# Altium footprint library CustomCase.PcbLib: 274 footprints (part 3 of 18)
Each footprint in its own frame and in the unit in brackets; x right, y up, seen from the top. Pads: shape width x height; smd on the part's side, far side on the other; paste and mask are expansions set on the pad; w line width, h text height; cw(c..) or ccw(c..) is an arc to the next point about the centre after c.
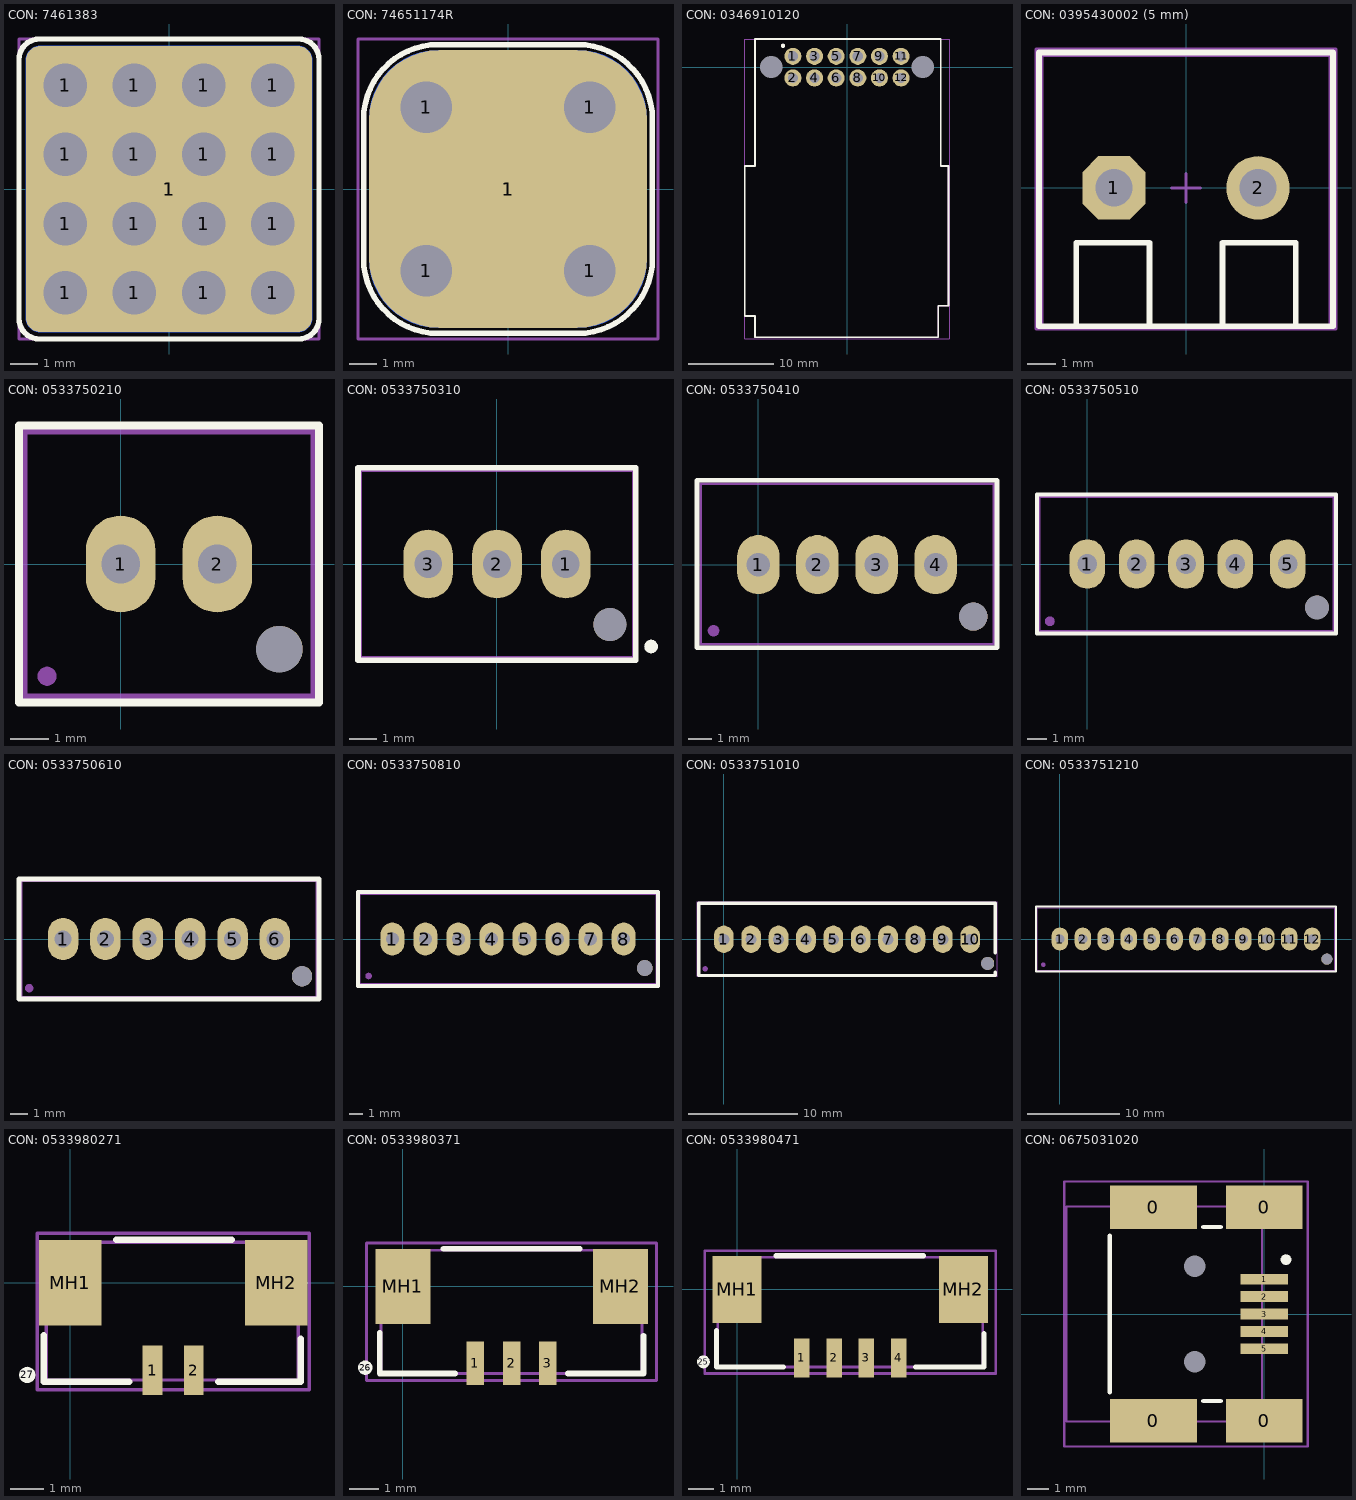
[diagram p2: the footprints below, top view; thin cyan lines are the x and y axes]

## CON: 7461383 [mm]
pads (18):
  round 2.5 hole 1.6: 1(-3.81,-3.81) 1(-3.81,-1.27) 1(-3.81,1.27) 1(-3.81,3.81) 1(-1.27,-3.81) 1(-1.27,-1.27) 1(-1.27,1.27) 1(-1.27,3.81) 1(1.27,-3.81) 1(1.27,-1.27) 1(1.27,1.27) 1(1.27,3.81) 1(3.81,-3.81) 1(3.81,-1.27) 1(3.81,1.27) 1(3.81,3.81)
  rrect10% 10.5x10.5 smd: 1(0,0)
  rrect10% 10.5x10.5 smd far side: 1(0,0)
Top Overlay:
  lines w0.2: -5.5,-4.75 ccw(c-4.75,-4.75) -4.75,-5.5 4.75,-5.5 ccw(c4.75,-4.75) 5.5,-4.75 5.5,4.75 ccw(c4.75,4.75) 4.75,5.5 -4.75,5.5 ccw(c-4.75,4.75) -5.5,4.75 -5.5,-4.75
Top Assy:
  lines w0.1: -4.5,-4.5 -4.5,4.5 ; -4.5,-4.5 -4.5,-4.5 ; -4.5,-4.5 4.5,-4.5 4.5,4.5 -4.5,4.5 ; -4.5,4.5 -4.5,4.5
Size Area:
  lines w0.1: -0.5,0 0.5,0 ; 0,-0.5 0,0.5 ; -5.5,-5.5 5.5,-5.5 5.5,5.5 -5.5,5.5 -5.5,-5.5
3D body "7461383.STEP": height 12.5, standoff -3.5, extent -4.5,-4.5 4.5,4.5

## CON: 74651174R [mm]
pads (6):
  round 3.2 hole 1.85: 1(-2.94,-2.94) 1(-2.94,2.94) 1(2.94,-2.94) 1(2.94,2.94)
  rrect50% 10x10 smd: 1(0,0)
  rrect50% 10x10 smd far side: 1(0,0)
Top Overlay:
  lines w0.2: -5.2,-2.5 ccw(c-2.5,-2.5) -2.5,-5.2 2.5,-5.2 ccw(c2.5,-2.5) 5.2,-2.5 5.2,2.5 ccw(c2.5,2.5) 2.5,5.2 -2.5,5.2 ccw(c-2.5,2.5) -5.2,2.5 -5.2,-2.5
Top Assy:
  circle w0.1: c0,0 r1.5
  lines w0.1: 0,2 ccw(c0,0) 2,0 ; -3.5,-3.5 3.5,-3.5 3.5,3.5 -3.5,3.5 -3.5,-3.5
Size Area:
  lines w0.1: -5.4,-5.4 5.4,-5.4 5.4,5.4 -5.4,5.4 -5.4,-5.4
3D body "74651174 (rev1).stp": height 8.5, standoff -2.5, extent -3.5,-3.5 3.5,3.5

## CON: 0346910120 [mm]
pads (16):
  round 2 hole 1.2: 1(-6.35,1.27) 2(-6.35,-1.27) 3(-3.81,1.27) 4(-3.81,-1.27) 5(-1.27,1.27) 6(-1.27,-1.27) 7(1.27,1.27) 8(1.27,-1.27) 9(3.81,1.27) 10(3.81,-1.27) 11(6.35,1.27) 12(6.35,-1.27)
  round 0 hole 2.6: ""(-8.89,0) ""(8.89,0)
  round 0.5 on Top Overlay: ""(-7.5,2.5)
  round 0.5 on Mech1: ""(-7.5,2.5)
Top Overlay:
  lines w0.2: -12,-29.2 -10.8,-29.2 -10.8,-31.7 10.7,-31.7 10.7,-28 11.9,-28 11.9,-11.6 11,-11.6 11,3.3 -10.8,3.3 -10.8,-11.6 -12,-11.6 -12,-29.2
Top Assy:
  lines w0.1: -12,-29.2 -12,-11.6 -10.8,-11.6 -10.8,3.3 11,3.3 11,-11.6 11.9,-11.6 11.9,-28 10.7,-28 10.7,-31.7 -10.8,-31.7 -10.8,-29.2 -12,-29.2
Size Area:
  lines w0.1: -12,-31.9 -12,3.3 12,3.3 12,-31.9 -12,-31.9
3D body "2.STEP": height 22.06, standoff -3.4, extent -12,-31.882 11.94,3.282

## CON: 0395430002 (5 mm) [mm] "2 pin 5.08mm screw connector"
height 12.5
pads (2):
  oct 2.2x2.2 hole 1.3: 1(-2.5,0)
  round 2.2 hole 1.3: 2(2.5,0)
Top Overlay:
  lines w0.2: -3.81,-4.8 -3.81,-1.905 -1.27,-1.905 -1.27,-4.8 ; 1.27,-4.8 1.27,-1.905 3.81,-1.905 3.81,-4.8 ; -5.1,-4.8 -5.1,4.7 5.1,4.7 5.1,-4.8 -5.1,-4.8
Top Assy:
  lines w0.1: -3.8,-4.799 -3.8,-1.9 -1.3,-1.9 -1.3,-4.799 ; 1.3,-4.8 1.3,-1.9 3.8,-1.9 3.8,-4.799 ; -5.004,-4.799 5.004,-4.799 5.004,4.599 -5.004,4.599 -5.004,-4.799
Size Area:
  lines w0.1: -0.5,0 0.5,0 ; 0,-0.5 0,0.5 ; -5.207,-4.9 -5.207,4.826 5.207,4.826 5.207,-4.9 -5.207,-4.9
3D body "395430002.SLDPRT": height 14.63, standoff -3.43, extent -5.004,-4.799 5.004,4.599

## CON: 0533750210 [mm] "MOLEX Mini-Lock"
height 11.5
pads (4):
  oval 1.8x2.5 hole 1: 1(0,0) 2(2.5,0)
  round 0.5 on Mech1: ""(-1.9,-2.9)
  round 1.2 hole 1.2: ""(4.1,-2.2)
Top Overlay:
  lines w0.2: -2.625,-3.575 5.125,-3.575 5.125,3.575 -2.625,3.575 -2.625,-3.575
Top Assy:
  lines w0.1: -2.45,-3.4 4.95,-3.4 4.95,3.4 -2.45,3.4 -2.45,-3.4
Size Area:
  lines w0.1: -2.5,-3.5 -2.5,3.5 5,3.5 5,-3.5 -2.5,-3.5
3D body "533750210.stp": height 11.75, standoff -3.18, extent -2.45,-3.4 4.95,3.4

## CON: 0533750310 [mm]
pads (6):
  oval 1.8x2.5 hole 1: 1(2.5,0) 2(0,0) 3(-2.5,0)
  round 1.2 hole 1.2: ""(4.1,-2.2)
  round 0.5 on Mech1: ""(4.1,-2.2)
  round 0.5 on Top Overlay: ""(5.6,-3)
Top Overlay:
  lines w0.2: -5.05,-3.5 5.05,-3.5 5.05,3.5 -5.05,3.5 -5.05,-3.5
Top Assy:
  lines w0.1: -4.95,-3.4 -4.95,3.4 4.95,3.4 4.95,-3.4 -4.95,-3.4
Size Area:
  lines w0.1: -0.5,0 0.5,0 ; 0,-0.5 0,0.5 ; -5,-3.5 5,-3.5 5,3.5 -5,3.5 -5,-3.5
3D body "533750310.stp": height 11.55, standoff -3.38, extent -4.95,-3.4 4.95,3.4

## CON: 0533750410 [mm] "MOLEX Mini-Lock"
height 11.5
pads (6):
  oval 1.8x2.5 hole 1: 1(0,0) 2(2.5,0) 3(5,0) 4(7.5,0)
  round 0.5 on Mech1: ""(-1.9,-2.8)
  round 1.2 hole 1.2: ""(9.1,-2.2)
Top Overlay:
  lines w0.2: -2.6,-3.525 10.1,-3.525 10.1,3.575 -2.6,3.575 -2.6,-3.525
Top Assy:
  lines w0.1: -2.441,-3.374 9.959,-3.374 9.959,3.426 -2.441,3.426 -2.441,-3.374
3D body "533750410.stp": height 11.55, standoff -3.38, extent -2.441,-3.374 9.959,3.426

## CON: 0533750510 [mm] "MOLEX Mini-Lock"
height 11.5
pads (7):
  oval 1.8x2.5 hole 1: 1(0,0) 2(2.5,0) 3(5,0) 4(7.5,0) 5(10.16,0)
  round 0.5 on Mech1: ""(-1.9,-2.9)
  round 1.2 hole 1.2: ""(11.64,-2.2)
Top Overlay:
  lines w0.2: -2.55,-3.525 -2.55,3.525 12.6,3.525 12.6,-3.525 -2.55,-3.525
Top Assy:
  lines w0.1: -2.425,-3.4 12.475,-3.4 12.475,3.4 -2.425,3.4 -2.425,-3.4
Size Area:
  lines w0.1: -2.6,-3.5 -2.6,3.5 12.6,3.5 12.6,-3.5 -2.6,-3.5
3D body "533750510.stp": height 11.55, standoff -3.38, extent -2.425,-3.4 12.475,3.4

## CON: 0533750610 [mm] "MOLEX Mini-Lock"
height 11.5
pads (8):
  oval 1.8x2.5 hole 1: 1(10,0) 2(12.5,0) 3(15,0) 4(17.5,0) 5(20,0) 6(22.5,0)
  round 0.5 on Mech1: ""(8,-2.9)
  round 1.2 hole 1.2: ""(24.1,-2.2)
Top Overlay:
  lines w0.3: 7.4,-3.55 25.1,-3.55 25.1,3.55 7.4,3.55 7.4,-3.55
Top Assy:
  lines w0.1: 7.55,-3.4 7.55,3.4 24.95,3.4 24.95,-3.4 7.55,-3.4
3D body "533750610.stp": height 11.55, standoff -3.38, extent 7.55,-3.4 24.95,3.4

## CON: 0533750810 [mm] "MOLEX Mini-Lock"
height 11.5
pads (10):
  oval 1.8x2.5 hole 1: 1(5,0) 2(7.5,0) 3(10,0) 4(12.5,0) 5(15,0) 6(17.5,0) 7(20,0) 8(22.5,0)
  round 0.5 on Mech1: ""(3.2,-2.8)
  round 1.2 hole 1.2: ""(24.1,-2.2)
Top Overlay:
  lines w0.3: 2.4,-3.55 25.1,-3.55 25.1,3.55 2.4,3.55 2.4,-3.55
Top Assy:
  lines w0.1: 2.55,-3.4 24.95,-3.4 24.95,3.4 2.55,3.4 2.55,-3.4
3D body "533750810.stp": height 11.55, standoff -3.38, extent 2.55,-3.4 24.95,3.4

## CON: 0533751010 [mm] "MOLEX Mini-Lock"
height 11.5
pads (12):
  oval 1.8x2.5 hole 1: 1(0,0) 2(2.5,0) 3(5,0) 4(7.5,0) 5(10,0) 6(12.5,0) 7(15,0) 8(17.5,0) 9(20,0) 10(22.5,0)
  round 0.5 on Mech1: ""(-1.7,-2.7)
  round 1.2 hole 1.2: ""(24.1,-2.2)
Top Overlay:
  lines w0.3: 24.8,-3 24.8,-3.3 -2.3,-3.3 -2.3,3.3 24.8,3.3 24.8,-1.25
Top Assy:
  lines w0.1: -2.448,-3.374 24.952,-3.374 24.952,3.426 -2.448,3.426 -2.448,-3.374
3D body "533751010.stp": height 11.55, standoff -3.38, extent -2.448,-3.374 24.952,3.426

## CON: 0533751210 [mm] "MOLEX Mini-Lock"
height 11.5
pads (14):
  oval 1.8x2.5 hole 1: 1(0,0) 2(2.5,0) 3(5,0) 4(7.5,0) 5(10,0) 6(12.5,0) 7(15,0) 8(17.5,0) 9(20,0) 10(22.5,0) 11(25,0) 12(27.5,0)
  round 0.5 on Mech1: ""(-1.8,-2.8)
  round 1.2 hole 1.2: ""(29.1,-2.2)
Top Overlay:
  lines w0.254: -2.6,-3.55 -2.6,3.55 30.1,3.55 30.1,-3.55 -2.6,-3.55
Top Assy:
  lines w0.1: -2.45,-3.4 -2.45,3.4 29.95,3.4 29.95,-3.4 -2.45,-3.4
3D body "533751210.stp": height 11.55, standoff -3.38, extent -2.45,-3.4 29.95,3.4

## CON: 0533980271 [mm] "Pitch 1.25mm 2 pin Vertical SMT"
height 4.8
pads (5):
  rect 0.6x1.5 smd: 1(2.5,-2.65) 2(3.75,-2.65)
  round 0.5 on Top Overlay: 27(-1.3,-2.8)
  rect 1.9x2.6 smd: MH1(0,0) MH2(6.25,0)
Top Overlay:
  lines w0.2: -0.8,-1.6 -0.8,-3 1.8,-3 ; 1.4,1.3 4.9,1.3 ; 4.5,-3 7,-3 7,-1.7
Top Assy:
  lines w0.1: -0.725,-2.95 6.9,-2.95 6.925,-2.925 6.925,1.225 -0.725,1.225 -0.725,-1.5 -0.725,-2.95
Size Area:
  lines w0.1: -1,-3.25 7.25,-3.25 7.25,1.5 -1,1.5 -1,-3.25
3D body "533980271.stp": height 4.7, standoff 0, extent -0.725,-2.95 6.925,1.25

## CON: 0533980371 [mm] "Pitch 1.25mm 3 pin Vertical SMT"
height 4.8
pads (6):
  rect 0.6x1.5 smd: 1(2.5,-2.65) 2(3.75,-2.65) 3(5,-2.65)
  round 0.5 on Top Overlay: 26(-1.3,-2.8)
  rect 1.9x2.6 smd: MH1(0,0) MH2(7.5,0)
Top Overlay:
  lines w0.2: -0.8,-1.6 -0.8,-3 1.8,-3 ; 1.4,1.3 6.1,1.3 ; 5.7,-3 8.3,-3 8.3,-1.7
Top Assy:
  lines w0.1: -0.75,-3 -0.75,1.25 8.25,1.25 8.25,-3 -0.75,-3
Size Area:
  lines w0.1: -1.25,-3.25 -1.25,1.5 8.75,1.5 8.75,-3.25 -1.25,-3.25
3D body "533980371.stp": height 4.7, standoff 0, extent -0.7,-2.95 8.2,1.25

## CON: 0533980471 [mm]
pads (7):
  rect 0.6x1.5 smd: 1(2.5,-2.65) 2(3.75,-2.65) 3(5,-2.65) 4(6.25,-2.65)
  round 0.5 on Top Overlay: 25(-1.3,-2.8)
  rect 1.9x2.6 smd: MH1(0,0) MH2(8.75,0)
Top Overlay:
  lines w0.2: -0.8,-1.6 -0.8,-3 1.8,-3 ; 1.5,1.3 7.2,1.3 ; 6.9,-3 9.55,-3 9.55,-1.7
Top Assy:
  lines w0.1: -0.75,-3 9.5,-3 9.5,1.25 -0.75,1.25 -0.75,-3
Size Area:
  lines w0.1: -1.25,-3.25 10,-3.25 10,1.5 -1.25,1.5 -1.25,-3.25
3D body "533980471.stp": height 4.7, standoff 0, extent -0.7,-2.925 9.45,1.275

## CON: 0675031020 [mm]
pads (13):
  rect 4x2 smd: 0(-5.1,-4.9) 0(-5.1,4.9)
  rect 3.5x2 smd: 0(0,-4.9) 0(0,4.9)
  rect 2.2x0.5 smd: 1(0,1.6) 2(0,0.8) 3(0,0) 4(0,-0.8) 5(0,-1.6)
  round 0 hole 1: ""(-3.2,-2.2) ""(-3.2,2.2)
  round 0.5 on Mech1: ""(-0.6,4.5)
  round 0.5 on Top Overlay: ""(1,2.5)
Top Overlay:
  lines w0.2: -7.1,-3.6 -7.1,3.6 ; -2.8,-4 -2,-4 ; -2.8,4 -2,4
Top Assy:
  lines w0.1: -9.1,-4.95 -0.1,-4.95 -0.1,4.95 -9.1,4.95 -9.1,-4.95
Size Area:
  lines w0.1: -9.2,-6.1 2,-6.1 2,6.1 -9.2,6.1 -9.2,-6.1
3D body "675031020.stp": height 3.95, standoff -1, extent -9.1,-4.95 -0.1,4.95